# Altium footprint library CD's_LIB_2018.PcbLib: 155 footprints (part 1 of 10)
Each footprint in its own frame and in the unit in brackets; x right, y up, seen from the top. Pads: shape width x height; smd on the part's side, far side on the other; paste and mask are expansions set on the pad; w line width, h text height; cw(c..) or ccw(c..) is an arc to the next point about the centre after c.
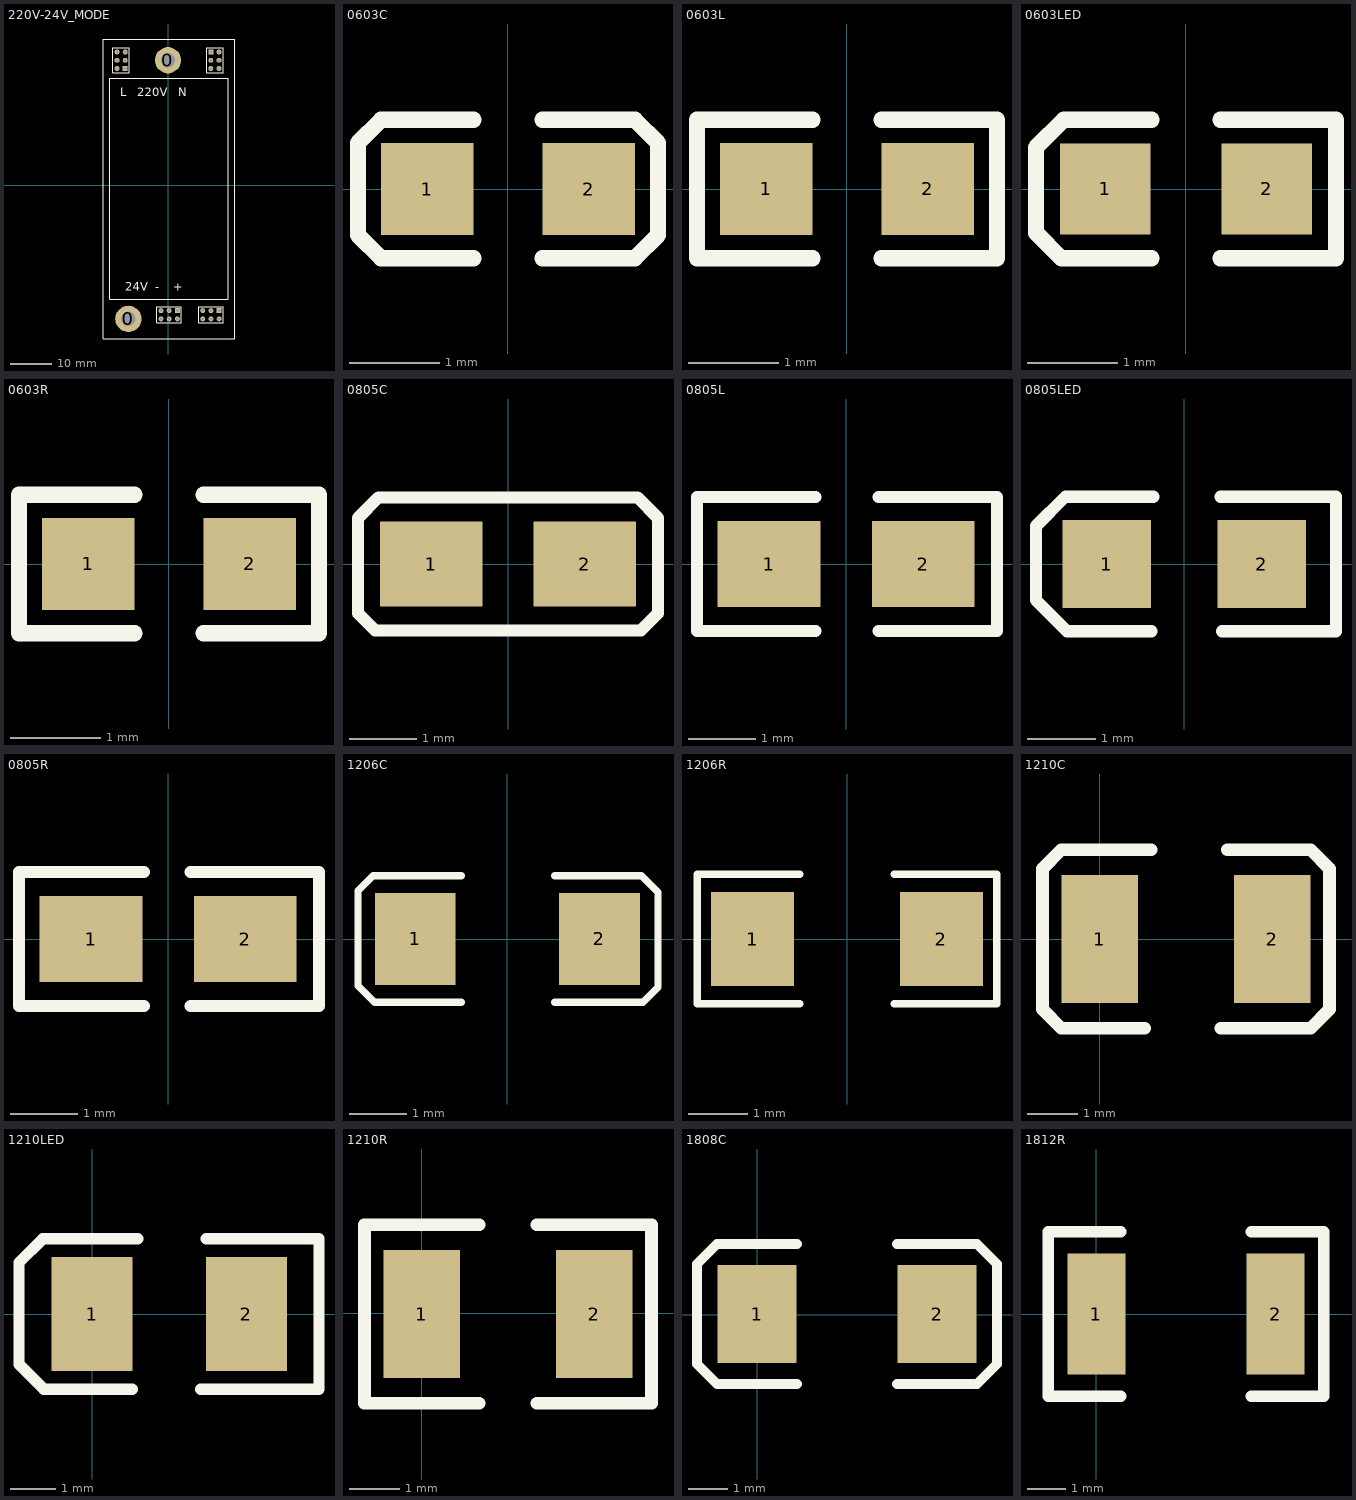
[diagram p0: the footprints below, top view; thin cyan lines are the x and y axes]

## 220V-24V_MODE [mm] "220V转24V模块"
pads (26):
  round 6.4 hole 3.5: 0(-9.655,-32.464) 0(-0.016,30.464)
  round 1.2 hole 0.75: 1(-12.43,28.464) 1(-12.43,30.464) 1(-12.43,32.464) 1(-10.43,30.464) 1(-10.43,32.464) 2(10.398,28.464) 2(10.398,30.464) 2(12.398,28.464) 2(12.398,30.464) 2(12.398,32.464) 3(8.43,-32.464) 3(8.43,-30.464) 3(10.43,-32.464) 3(10.43,-30.464) 3(12.43,-32.464) 4(-1.73,-32.464) 4(-1.73,-30.464) 4(0.27,-32.464) 4(0.27,-30.464) 4(2.27,-32.464)
  rect 1.2x1.2 hole 0.75: 1(-10.43,28.464) 2(10.398,32.464) 3(12.43,-30.464) 4(2.27,-30.464)
Top Overlay:
  lines w0.2: -13.43,27.464 -9.43,27.464 -9.43,33.464 -13.43,33.464 -13.43,27.464 ; -2.73,-33.464 -2.73,-29.464 3.27,-29.464 3.27,-33.464 -2.73,-33.464 ; 7.43,-33.464 7.43,-29.464 13.43,-29.464 13.43,-33.464 7.43,-33.464 ; 9.398,27.464 13.398,27.464 13.398,33.464 9.398,33.464 9.398,27.464
  lines w0.3: -15.771,-37.363 -15.771,35.637 0.229,35.637 16.229,35.637 16.229,-37.363 0.229,-37.363 -15.771,-37.363 ; -14.162,-27.7 14.638,-27.7 14.638,26.1 -14.162,26.1 -14.162,-27.7
  text "24V  -    +" at -10.422,-25.654 h2
  text "L   220V   N" at -11.692,21.742 h2

## 0603C [mil]
pads (2):
  rect 40x40 smd: 1(-35,0) 2(35,0)
Top Overlay:
  lines w7: -15,-30 -55,-30 -65,-20 -65,20 -55,30 -15,30 ; 15,-30 55,-30 65,-20 65,20 55,30 15,30
3D body: height 11.89, standoff 0, extent -31.49,-15.75 31.5,15.75

## 0603L [mil] "0603贴片电感"
pads (2):
  rect 40x40 smd: 1(-35,0) 2(35,0)
Top Overlay:
  lines w7: -15,-30 -65,-30 -65,30 -15,30 ; 15,-30 65,-30 65,30 15,30
3D body: height 11.81, standoff 0, extent -31.49,-15.74 31.5,15.75

## 0603LED [mm] "贴片LED"
pads (2):
  rect 1x1 smd: 1(-0.889,0) 2(0.889,0)
Top Overlay:
  lines w0.178: -0.381,-0.762 -1.372,-0.762 -1.651,-0.483 -1.651,0.457 -1.346,0.762 -0.381,0.762 ; 0.381,-0.762 1.651,-0.762 1.651,0.762 0.381,0.762
3D body: height 0.6, standoff 0, extent -0.81,-0.4 0.81,0.4

## 0603R [mil]
pads (2):
  rect 40x40 smd: 1(-35,0) 2(35,0)
Top Overlay:
  lines w7: -15,-30 -65,-30 -65,30 -15,30 ; 15,-30 65,-30 65,30 15,30
3D body: height 17.72, standoff 0, extent -31.49,-15.74 31.5,15.76

## 0805C [mil]
pads (2):
  rect 60x50 smd: 1(-45,0) 2(45,0)
Top Overlay:
  lines w7: -88,-29 -78,-39 78,-39 88,-29 88,-28 88,26 88,27 76,39 -76,39 -88,27 -88,-28 -88,-29
3D body: height 30.39, standoff -0.39, extent -39.37,-24.6 39.37,24.61

## 0805L [mil] "0805贴片电感"
pads (2):
  rect 60x50 smd: 1(-45,0) 2(45,0)
Top Overlay:
  lines w7: -18,-39 -87,-39 -87,39 -18,39 ; 19,-39 88,-39 88,39 19,39
3D body: height 19.68, standoff 0, extent -39.36,-24.6 39.38,24.61

## 0805LED [mm]
pads (2):
  rect 1.3x1.3 smd: 1(-1.143,0) 2(1.143,0)
Top Overlay:
  lines w0.178: -0.483,-0.991 -1.727,-0.991 -2.184,-0.533 -2.184,0.559 -1.753,0.991 -0.457,0.991 ; 0.533,0.991 2.235,0.991 2.235,-0.991 0.559,-0.991
3D body: height 1.1, standoff 0, extent -1.01,-0.625 1.01,0.625

## 0805R [mil]
pads (2):
  rect 60x50 smd: 1(-45,0) 2(45,0)
Top Overlay:
  lines w7: -14,-39 -87,-39 -87,39 -14,39 ; 13,-39 88,-39 88,39 13,39
3D body: height 21.65, standoff 0, extent -39.36,-24.8 39.38,24.81

## 1206C [mm]
pads (2):
  rect 1.4x1.6 smd: 1(-1.6,0) 2(1.6,0)
Top Overlay:
  lines w0.127: -0.8,-1.1 -2.304,-1.1 -2.591,-0.813 -2.591,0.838 -2.329,1.1 -0.8,1.1 ; 0.825,-1.1 2.354,-1.1 2.616,-0.838 2.616,0.813 2.329,1.1 0.825,1.1
3D body: height 0.95, standoff 0, extent -1.6,-0.813 1.6,0.787

## 1206R [mm]
pads (2):
  rect 1.4x1.6 smd: 1(-1.6,0) 2(1.6,0)
Top Overlay:
  lines w0.127: -0.8,-1.1 -2.54,-1.1 -2.54,1.1 -0.8,1.1 ; 0.8,-1.1 2.54,-1.1 2.54,1.1 0.8,1.1
3D body: height 0.54, standoff -0.01, extent -1.582,-0.8 1.618,0.8

## 1210C [mil]
pads (2):
  rect 60x100 smd: 1(0,0) 2(135,0)
Top Overlay:
  lines w10: 35,-70 -30,-70 -45,-55 -45,-50 -45,55 -30,70 40,70 ; 95,-70 165,-70 180,-55 180,50 180,55 165,70 100,70
3D body: height 54.89, standoff -0.23, extent 0,-53.15 133.86,53.15

## 1210LED [mm]
pads (2):
  rect 1.8x2.54 smd: 1(0,0) 2(3.429,0)
Top Overlay:
  lines w0.254: 0.889,-1.67 -1.073,-1.67 -1.626,-1.118 -1.626,1.143 -1.099,1.67 1.016,1.67 ; 2.413,-1.67 5.044,-1.67 5.044,1.67 2.54,1.67
3D body: height 1.39, standoff -0.01, extent 0,-1.35 3.4,1.35

## 1210R [mil]
pads (2):
  rect 60x100 smd: 1(0.14,-0.78) 2(135.14,-0.78)
Top Overlay:
  lines w10: -44.86,54.22 -44.86,-50.78 -44.86,-55.78 ; -34.86,-70.78 45.14,-70.78 ; -24.86,-70.78 -44.86,-70.78 -44.86,-55.78 ; 45.14,69.22 -44.86,69.22 -44.86,-55.78 ; 90.14,-70.78 180.14,-70.78 180.14,54.22 180.14,69.22 160.14,69.22 ; 90.14,69.22 170.14,69.22

## 1808C [mm]
pads (2):
  rect 2x2.5 smd: 1(-0.012,0.015) 2(4.56,0.015)
Top Overlay:
  lines w0.254: 1.004,-1.763 -1.028,-1.763 -1.536,-1.255 -1.536,1.285 -1.028,1.793 1.004,1.793 ; 3.544,-1.763 5.576,-1.763 6.084,-1.255 6.084,1.285 5.576,1.793 3.544,1.793

## 1812R [mil]
pads (2):
  rect 60x125 smd: 1(0,0) 2(185,0)
Top Overlay:
  lines w12: 25,-85 -50,-85 -50,85 25,85 ; 160,-85 235,-85 235,85 160,85